# Altium footprint library MercurialSDR.PcbLib: 87 footprints (part 5 of 6)
Each footprint in its own frame and in the unit in brackets; x right, y up, seen from the top. Pads: shape width x height; smd on the part's side, far side on the other; paste and mask are expansions set on the pad; w line width, h text height; cw(c..) or ccw(c..) is an arc to the next point about the centre after c.
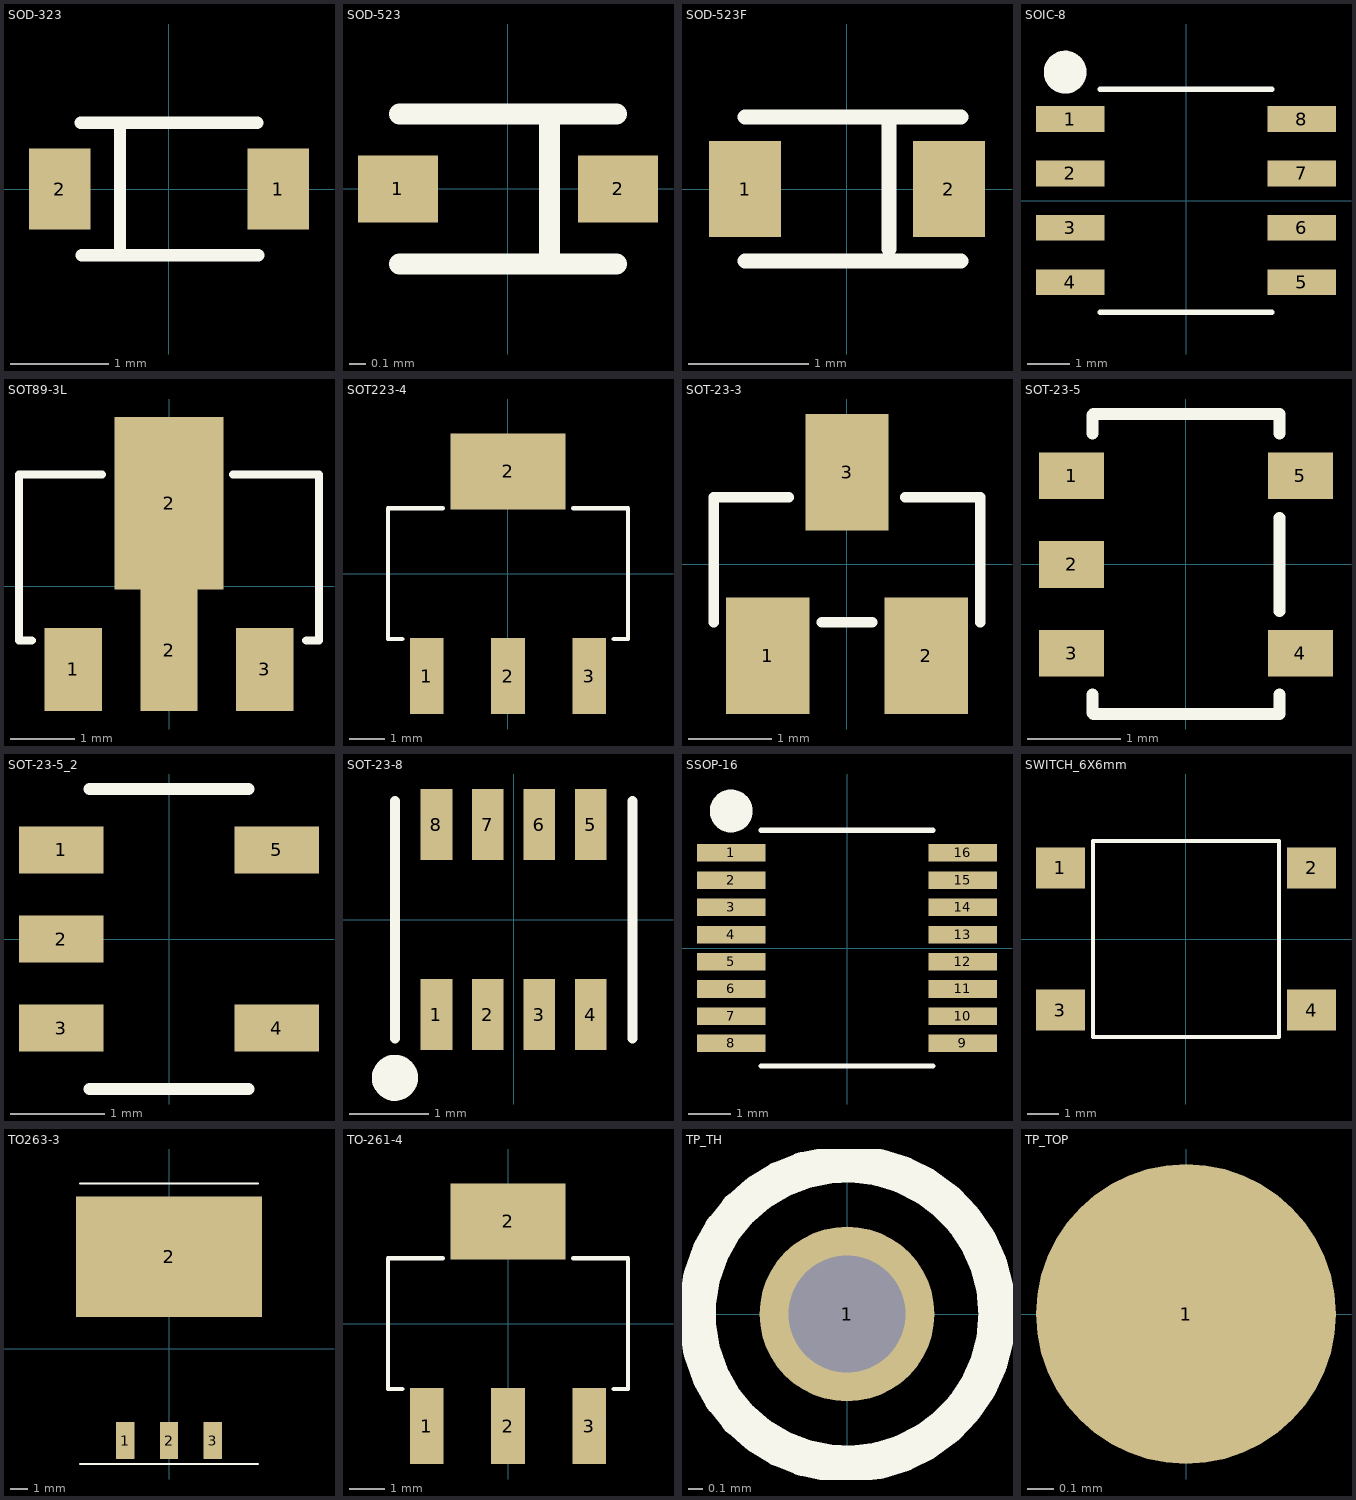
[diagram p4: the footprints below, top view; thin cyan lines are the x and y axes]

## SOD-323 [mm] "Diodo Schottkey"
pads (2):
  rect 0.63x0.83 smd: 1(1.115,0) 2(-1.115,0)
Top Overlay:
  lines w0.127: -0.9,0.675 0.9,0.675 ; -0.89,-0.675 0.91,-0.675 ; -0.5,-0.675 -0.5,0.67
3D body "NSR0530HT1G_SOD323.stp": height 1.1, standoff 0, extent -1.26,-0.625 1.24,0.625

## SOD-523 [mm]
pads (2):
  rect 0.48x0.4 smd: 1(-0.66,0) 2(0.66,0)
Top Overlay:
  lines w0.127: -0.65,-0.45 0.65,-0.45 ; -0.65,0.45 0.65,0.45 ; 0.25,-0.45 0.25,0.45
3D body "SOD-523.stp": height 0.7, standoff 0, extent -0.79,-0.395 0.81,0.405

## SOD-523F [mm]
pads (2):
  rect 0.6x0.8 smd: 1(-0.85,0) 2(0.85,0)
Top Overlay:
  lines w0.127: -0.85,-0.6 0.95,-0.6 ; -0.85,0.6 0.95,0.6 ; 0.35,-0.5 0.35,0.6
3D body "User Library-SOD523F.step": height 0.7, standoff 0, extent -0.8,-0.45 0.9,0.45

## SOIC-8 [mm] "Memoria Flash 256kb SOIC-8"
pads (8):
  rect 1.6x0.6 smd: 1(-2.7,1.905) 2(-2.7,0.635) 3(-2.7,-0.635) 4(-2.7,-1.905) 5(2.7,-1.905) 6(2.7,-0.635) 7(2.7,0.635) 8(2.7,1.905)
Top Overlay:
  circle w0.5: c-2.82,3 r0.25
  lines w0.127: -2,-2.6 2,-2.6 ; -2,2.6 2,2.6
3D body "User Library-PIC16LF18313-SOIC-8.step": height 1.75, standoff 0, extent -3,-2.445 3,2.455

## SOT89-3L [mm]
pads (4):
  rect 0.9x1.3 smd: 1(-1.5,-1.3) 3(1.5,-1.3)
  rect 0.9x1.9 smd: 2(0,-1)
  rect 1.7x2.7 smd: 2(0,1.3)
Top Overlay:
  lines w0.127: -2.15,-0.85 -2.35,-0.85 -2.35,1.75 -1.05,1.75 ; 1,1.75 2.35,1.75 2.35,-0.85 2.15,-0.85
3D body "User Library-SOT89-3.STEP": height 1.54, standoff 0, extent -2.25,-1.8 2.25,2.45

## SOT223-4 [mm] "Regulador Lineal 7805 SOT223-4"
pads (4):
  rect 0.95x2.15 smd: 1(-2.3,-2.9) 2(0,-2.9) 3(2.3,-2.9)
  rect 3.25x2.15 smd: 2(0,2.9)
Top Overlay:
  lines w0.127: -3,-1.85 -3.4,-1.85 -3.4,1.85 -1.85,1.85 ; 1.85,1.85 3.4,1.85 3.4,-1.85 3,-1.85
3D body "User Library- LM1117-SOT-223-1.step": height 1.69, standoff 0.04, extent -3.25,-3.5 3.25,3.5

## SOT-23-3 [mm]
pads (3):
  rect 1x1.4 smd: 1(-0.95,-1.1) 2(0.95,-1.1) 3(0,1.1)
Top Overlay:
  lines w0.127: -1.6,-0.7 -1.6,0.8 -0.7,0.8 ; -0.3,-0.7 0.3,-0.7 ; 0.7,0.8 1.6,0.8 1.6,-0.7
3D body "MCP1541T-I_TT.stp": height 1.12, standoff 0, extent -1.46,-1.185 1.46,1.185

## SOT-23-5 [mm]
pads (5):
  rect 0.7x0.5 smd: 1(-1.225,0.95) 2(-1.225,0) 3(-1.225,-0.95) 4(1.225,-0.95) 5(1.225,0.95)
Top Overlay:
  lines w0.127: -1,-1.39 -1,-1.59 -0.99,-1.6 -0.8,-1.6 0.8,-1.6 1,-1.6 1,-1.39 ; -1,1.4 -1,1.6 -0.99,1.61 -0.8,1.61 0.8,1.61 1,1.61 1,1.4 ; 1,-0.5 1,0.5
3D body "MCP6271T-E_OT.stp": height 1.45, standoff 0, extent -1.35,-1.45 1.35,1.45

## SOT-23-5_2 [mm]
pads (5):
  rect 0.9x0.5 smd: 1(-1.15,0.95) 2(-1.15,0) 3(-1.15,-0.95) 4(1.15,-0.95) 5(1.15,0.95)
Top Overlay:
  lines w0.127: -0.85,-1.6 0.85,-1.6 ; -0.85,1.6 0.85,1.6
3D body "OPA356AIDBVTG4.stp": height 1.45, standoff 0, extent -1.4,-1.45 1.4,1.45

## SOT-23-8 [mm]
pads (8):
  rect 0.4x0.9 smd: 1(-0.975,-1.2) 2(-0.325,-1.2) 3(0.325,-1.2) 4(0.975,-1.2) 5(0.975,1.2) 6(0.325,1.2) 7(-0.325,1.2) 8(-0.975,1.2)
Top Overlay:
  circle w0.3: c-1.5,-2 r0.141
  lines w0.127: -1.5,-1.5 -1.5,1.5 ; 1.5,-1.5 1.5,1.5
3D body "AD5061BRJZ-2500RL7.stp": height 1.45, standoff 0, extent -1.45,-1.4 1.45,1.4

## SSOP-16 [mm] "DAC PCM1781 SSOP-16"
pads (16):
  rect 1.6x0.41 smd: 1(-2.7,2.222) 2(-2.7,1.587) 3(-2.7,0.953) 4(-2.7,0.318) 5(-2.7,-0.318) 6(-2.7,-0.953) 7(-2.7,-1.587) 8(-2.7,-2.222) 9(2.7,-2.222) 10(2.7,-1.587) 11(2.7,-0.953) 12(2.7,-0.318) 13(2.7,0.318) 14(2.7,0.953) 15(2.7,1.587) 16(2.7,2.222)
Top Overlay:
  circle w0.5: c-2.7,3.2 r0.25
  lines w0.127: -2,-2.75 2,-2.75 ; -2,2.75 2,2.75
3D body "User Library-ssop-16 pos.step": height 0.5, standoff -0.6, extent -2.997,-2.467 2.997,2.512

## SWITCH_6X6mm [mm] "Pulsador 6mm x 6mm"
pads (4):
  rect 1.55x1.3 smd: 1(-3.975,2.25) 2(3.975,2.25) 3(-3.975,-2.25) 4(3.975,-2.25)
Top Overlay:
  lines w0.127: -2.95,-3.1 -2.95,3.1 2.95,3.1 2.95,-3.1 -2.95,-3.1
3D body "User Library-pulsador6x6.STEP": height 4.3, standoff 0, extent -4.475,-3.05 4.525,2.95

## TO263-3 [mm] "TO263-3"
pads (4):
  rect 1.07x2.16 smd: 1(-2.54,-5.335) 2(0,-5.335) 3(2.54,-5.335)
  rect 10.8x7 smd: 2(0,5.335)
Top Overlay:
  lines w0.127: -5.18,-6.7 5.18,-6.7 ; -5.18,9.6 5.18,9.6
3D body "User Library-TO263-3.STEP": height 4.68, standoff -0.12, extent -4.99,-6.32 5.01,9.35

## TO-261-4 [mm] "Regulador Lineal LM1117-33 TO-261-4"
pads (4):
  rect 0.95x2.15 smd: 1(-2.3,-2.9) 2(0,-2.9) 3(2.3,-2.9)
  rect 3.25x2.15 smd: 2(0,2.9)
Top Overlay:
  lines w0.127: -3,-1.85 -3.4,-1.85 -3.4,1.85 -1.85,1.85 ; 1.85,1.85 3.4,1.85 3.4,-1.85 3,-1.85
3D body "User Library- LM1117-SOT-223-1.step": height 1.69, standoff 0.04, extent -3.25,-3.5 3.25,3.5

## TP_TH [mm]
pads (1):
  round 1.2 hole 0.8: 1(0,0)
Top Overlay:
  circle w0.254: c0,0 r1.03

## TP_TOP [mm]
pads (1):
  round 1.15 smd: 1(0,0)